# Altium footprint library Miscellaneous Devices LC.PcbLib: 776 footprints (part 7 of 49)
Each footprint in its own frame and in the unit in brackets; x right, y up, seen from the top. Pads: shape width x height; smd on the part's side, far side on the other; paste and mask are expansions set on the pad; w line width, h text height; cw(c..) or ccw(c..) is an arc to the next point about the centre after c.
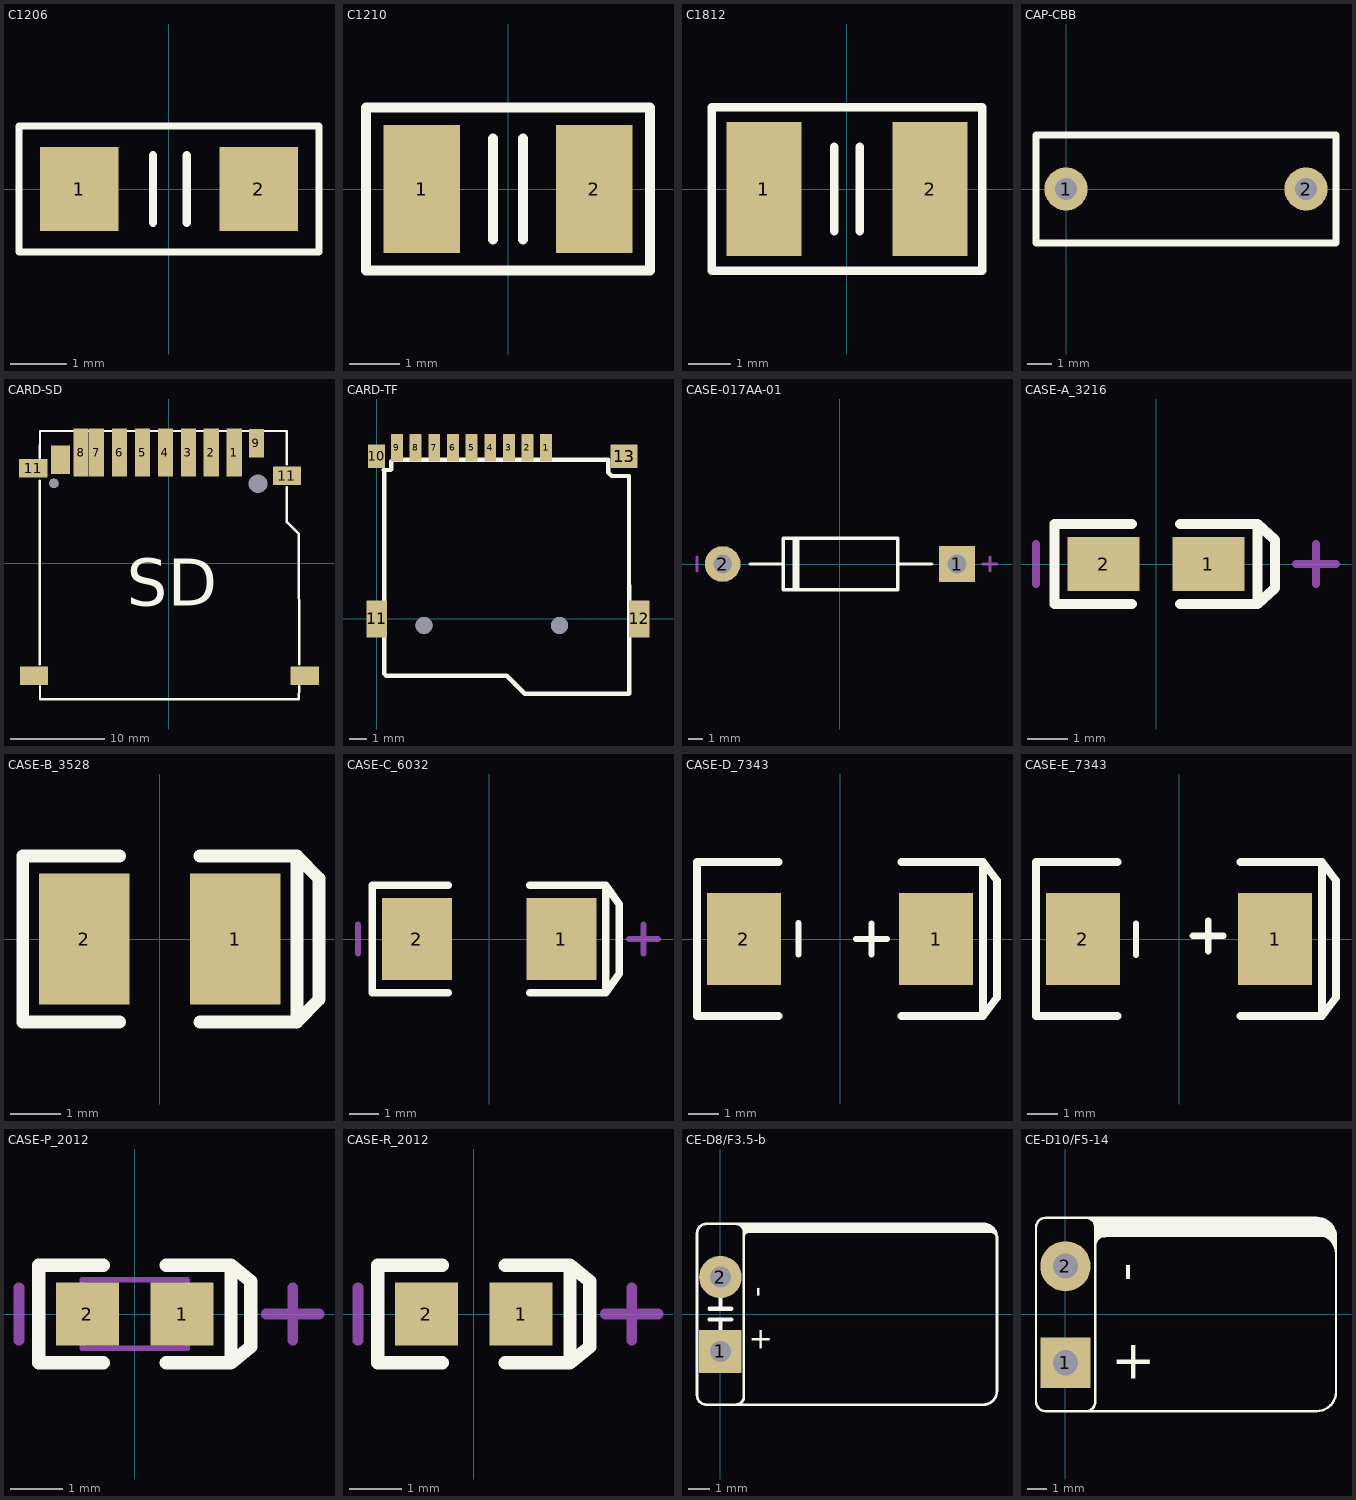
[diagram p6: the footprints below, top view; thin cyan lines are the x and y axes]

## C1206 [mm]
pads (2):
  rect 1.4x1.5 smd: 1(-1.6,0) 2(1.6,0)
Top Overlay:
  lines w0.127: -2.675,-1.125 2.675,-1.125 2.675,1.125 -2.675,1.125 -2.675,-1.125
  lines w0.15: -0.285,-0.6 -0.285,0.6 ; 0.315,-0.6 0.315,0.6
3D body "1206_C.step": height 0, standoff -0.94, extent -1.651,-0.762 1.549,0.838

## C1210 [mil]
pads (2):
  rect 60x100 smd: 1(-67.5,0) 2(67.5,0)
Top Overlay:
  lines w7.87: -11.81,-39.37 -11.81,39.37 ; 11.81,-39.37 11.81,39.37 ; -111.28,-63.78 -111.28,63.78 111.28,63.78 111.28,-63.78 -111.28,-63.78
3D body "1210_C.step": height 37.01, standoff 0, extent -65,-50 60.98,48.43

## C1812 [mil]
pads (2):
  rect 70x125 smd: 1(-77.5,0) 2(77.5,0)
Top Overlay:
  lines w7.87: -11.81,-39.37 -11.81,39.37 ; 11.81,-39.37 11.81,39.37 ; -126.28,-76.26 126.28,-76.26 126.28,76.26 -126.28,76.26 -126.28,-76.26
3D body "1812_C.step": height 48.82, standoff 0, extent -88.58,-65 88.58,60.98

## CAP-CBB [mm]
pads (2):
  round 1.8 hole 0.9: 1(0,0) 2(10,0)
Top Overlay:
  lines w0.305: -1.25,-2.25 -1.25,2.25 11.25,2.25 11.25,-2.25 -1.25,-2.25

## CARD-SD [mm]
pads (16):
  rect 1.6x5.08 smd: 1(6.913,11.712) 2(4.483,11.712) 3(2.053,11.712) 4(-0.377,11.712) 5(-2.807,11.712) 6(-5.237,11.712) 7(-7.667,11.712) 8(-9.327,11.712)
  rect 1.6x3 smd: 9(9.273,12.712)
  rect 3x2 smd: 11(-14.4,10.05) 11(12.5,9.25) ""(-14.3,-11.95) ""(14.4,-11.95)
  round 1 hole 1: ""(-12.2,8.45)
  rect 2x3 smd: ""(-11.5,10.95)
  round 1.8 hole 2: ""(9.444,8.41)
Top Overlay:
  lines w0.254: -13.7,-10.75 -13.7,8.75 ; -13.7,11.15 -13.67,13.998 12.492,13.998 12.5,10.45 ; -13.67,-13.05 -13.67,-14.45 13.762,-14.45 13.8,-13.05 ; 12.5,8.05 12.492,4.346 13.762,3.076 13.8,-10.75
  text "SD" at -4.5,-4.55 h5

## CARD-TF [mm]
pads (13):
  rect 0.7x1.6 smd: 1(10,10.1) 2(8.9,10.1) 3(7.8,10.1) 4(6.7,10.1) 5(5.6,10.1) 6(4.5,10.1) 7(3.4,10.1) 8(2.3,10.1) 9(1.2,10.1)
  rect 1x1.4 smd: 10(0,9.6)
  rect 1.2x2.2 smd: 11(0,0) 12(15.5,0)
  rect 1.6x1.4 smd: 13(14.6,9.6)
via 2.8,-0.4 diameter 1 hole 1
via 10.8,-0.4 diameter 1 hole 1
Top Overlay:
  lines w0.254: 14.88,-4.42 8.738,-4.42 7.671,-3.353 0.559,-3.353 0.457,-3.251 0.457,8.738 0.406,8.788 0.813,8.788 0.864,8.839 0.864,9.296 0.965,9.398 13.665,9.398 13.665,8.636 13.868,8.433 14.884,8.433 14.9,-4.4
3D body "TF-15X15.STEP": height 0.15, standoff -2.25, extent -0.325,-4.525 15.825,10.575

## CASE-017AA-01 [mm] "=CASE 017AA-01 Diode"
pads (2):
  rect 2.5x2.5 hole 1.3: 1(8.2,0)
  round 2.5 hole 1.3: 2(-8.2,0)
Top Overlay:
  lines w0.203: -6.3,0 -3.95,0 ; 4.1,0 6.45,0
  lines w0.254: -3.2,-1.8 -3.2,1.8 ; -2.95,-1.8 -2.95,1.8 ; -3.95,-1.8 4.05,-1.8 4.05,1.8 -3.95,1.8 -3.95,-1.8
Mechanical 15:
  lines w0.203: -10,-0.5 -10,0.5 ; 10,0 11,0 ; 10.5,-0.5 10.5,0.5
3D body "CASE 017AA-01.STEP": height 4.27, standoff -2.5, extent -8.75,-1.772 8.75,1.772

## CASE-A_3216 [mm]
pads (2):
  rect 1.8x1.35 smd: 1(1.31,0) 2(-1.31,0)
Top Overlay:
  lines w0.254: -0.6,-1.002 -2.537,-1.002 -2.537,1.002 -0.6,1.002 ; 0.6,-1.002 2.537,-1.002 ; 0.6,1.002 2.537,1.002 ; 2.537,-1.002 2.973,-0.6 2.973,0.6 2.537,1.002 ; 2.537,-1.002 2.537,1.002
Mechanical 15:
  lines w0.203: -3,-0.5 -3,0.5 ; 3.5,0 4.5,0 ; 4,-0.5 4,0.5
3D body "User Library-AVX_ACASE.STEP": height 1.71, standoff 0, extent -1.7,-0.84 1.7,0.84

## CASE-B_3528 [mm]
pads (2):
  rect 1.8x2.6 smd: 1(1.5,0) 2(-1.5,0)
Top Overlay:
  lines w0.254: -0.8,-1.65 -2.727,-1.65 -2.727,1.65 -0.8,1.65 ; 0.8,-1.65 2.727,-1.65 ; 0.8,1.65 2.727,1.65 ; 2.727,-1.65 3.163,-1.2 3.163,1.2 2.727,1.65 ; 2.727,-1.65 2.727,1.65
3D body "User Library-AVX_BCASE.STEP": height 2.03, standoff 0, extent -1.85,-1.465 1.85,1.465

## CASE-C_6032 [mm]
pads (2):
  rect 2.4x2.8 smd: 1(2.48,0) 2(-2.48,0)
Top Overlay:
  lines w0.254: -1.4,-1.85 -4.007,-1.85 -4.007,1.85 -1.4,1.85 ; 1.4,-1.85 4.007,-1.85 ; 1.4,1.85 4.007,1.85 ; 4.007,-1.85 4.47,-1.2 4.47,1.2 4.007,1.85 ; 4.007,-1.85 4.007,1.85
Mechanical 15:
  lines w0.203: -4.5,-0.5 -4.5,0.5 ; 4.8,0 5.8,0 ; 5.3,-0.5 5.3,0.5
3D body "User Library-AVX_C_CASE.STEP": height 2.7, standoff 0, extent -3.05,-1.675 3.05,1.675

## CASE-D_7343 [mm]
pads (2):
  rect 2.4x3 smd: 1(3.12,0) 2(-3.12,0)
Top Overlay:
  lines w0.203: -1.346,-0.492 -1.346,0.508 ; 0.522,0 1.522,0 ; 1.022,-0.5 1.022,0.5
  lines w0.254: -2,-2.5 -4.647,-2.5 -4.647,2.5 -2,2.5 ; 2,-2.5 4.647,-2.5 ; 2,2.5 4.647,2.5 ; 4.647,-2.5 4.647,2.5 ; 4.647,-2.5 5.1,-1.9 5.1,1.9 4.647,2.5
3D body "User Library-AVX_D_CASE.STEP": height 3.01, standoff 0, extent -3.701,-2.225 3.7,2.225

## CASE-E_7343 [mm]
pads (2):
  rect 2.4x3 smd: 1(3.12,0) 2(-3.12,0)
Top Overlay:
  lines w0.203: -1.397,-0.508 -1.397,0.492 ; 0.445,0.102 1.445,0.102 ; 0.945,-0.398 0.945,0.602
  lines w0.254: -2,-2.5 -4.647,-2.5 -4.647,2.5 -2,2.5 ; 2,-2.5 4.647,-2.5 ; 2,2.5 4.647,2.5 ; 4.647,-2.5 5.1,-1.9 5.1,1.9 4.647,2.5 ; 4.647,-2.5 4.647,2.5
3D body "User Library-AVX_E_CASE.STEP": height 4.2, standoff 0, extent -3.701,-2.225 3.7,2.225

## CASE-P_2012 [mm]
pads (2):
  rect 1.2x1.2 smd: 1(0.9,0) 2(-0.9,0)
Top Overlay:
  lines w0.254: -0.6,-0.927 -1.827,-0.927 -1.827,0.927 -0.6,0.927 ; 0.6,-0.927 1.827,-0.927 ; 0.6,0.927 1.827,0.927 ; 1.827,-0.927 1.827,0.927 ; 1.827,-0.927 2.2,-0.623 2.2,0.623 1.827,0.927
Mechanical 13:
  lines w0.1: -1,-0.65 -1,0.65 1,0.65 1,-0.65 -1,-0.65
Mechanical 15:
  lines w0.203: -2.2,-0.5 -2.2,0.5 ; 2.5,0 3.5,0 ; 3,-0.5 3,0.5

## CASE-R_2012 [mm]
pads (2):
  rect 1.2x1.2 smd: 1(0.9,0) 2(-0.9,0)
Top Overlay:
  lines w0.254: -0.6,-0.927 -1.827,-0.927 -1.827,0.927 -0.6,0.927 ; 0.6,-0.927 1.827,-0.927 ; 0.6,0.927 1.827,0.927 ; 1.827,-0.927 2.2,-0.623 2.2,0.623 1.827,0.927 ; 1.827,-0.927 1.827,0.927
Mechanical 15:
  lines w0.203: -2.2,-0.5 -2.2,0.5 ; 2.5,0 3.5,0 ; 3,-0.5 3,0.5
3D body "User Library-CaseR_2012-12.STEP": height 1.2, standoff 0, extent -1,-0.65 1,0.65

## CE-D8/F3.5-b [mm]
pads (2):
  rect 2x2 hole 1: 1(0,-1.75)
  round 2 hole 1: 2(0,1.75)
Top Overlay:
  region: 1.15,4.25 1,4.25 1,4.075 1.15,4.075
  region: 12.737,4.063 12.575,4.225 12.413,4.062 12.575,3.9
  region: 12.575,4.225 1.4,4.225 1.4,3.9 12.575,3.9
  region: 1.525,4.275 1.1,4.275 1.1,3.925 1.525,3.925
  region: 12.888,3.963 12.7,4.15 12.587,4.038 12.775,3.85
  region: 12.938,3.913 12.825,4.025 12.737,3.938 12.85,3.825
  region: 12.775,4.025 12.575,4.025 12.575,3.875 12.775,3.875
  lines w0.127: 0.725,-4.25 ccw(c0.725,-3.875) 1.1,-3.875 1.1,3.925 ; 0.725,4.25 cw(c0.725,3.875) 1.1,3.875 12.725,3.875 cw(c12.725,3.6) 13,3.6 ; 1.1,3.675 cw(c1.3,3.675) 1.3,3.875 ; 13,3.6 ccw(c12.35,3.6) 12.35,4.25 0.55,4.25 -0.65,4.25 ccw(c-0.65,3.8) -1.1,3.8 -1.1,-3.8 ccw(c-0.65,-3.8) -0.65,-4.25 0.55,-4.25 12.35,-4.25 ccw(c12.35,-3.6) 13,-3.6 13,3.6
  lines w0.2: -0.508,-0.25 0.508,-0.25 ; -0.508,0.258 0.508,0.258 ; 0,-0.758 0,-0.25 ; 0,0.258 0,0.766
  text "+" at 1.325,-1.625 h1
  text "-" at 2.175,0.8 h1
3D body "8X12.STEP": height -0.5, standoff -8.5, extent -1.165,-3.937 13.335,4.063

## CE-D10/F5-14 [mm]
pads (2):
  rect 2.6x2.6 hole 1.3: 1(0,-2.5)
  round 2.6 hole 1.3: 2(0,2.5)
Top Overlay:
  region: 1.8,4.125 1.6,4.125 1.6,4 1.8,4
  region: 1.7,4.15 1.55,4.15 1.55,3.925 1.7,3.925
  region: 1.5,5.05 1.35,5.05 1.35,4.85 1.5,4.85
  region: 1.7,5.025 1.45,5.025 1.45,4.725 1.7,4.725
  region: 14,3.8 13.85,3.8 13.85,3.625 14,3.625
  region: 14,3.925 13.775,3.925 13.775,3.725 14,3.725
  region: 13.8,4.125 13.575,4.125 13.575,3.9 13.8,3.9
  region: 14,4.075 13.7,4.075 13.7,3.825 14,3.825
  region: 13.7,4.25 13.275,4.25 13.275,4.025 13.7,4.025
  region: 13.9,4.475 13.625,4.475 13.625,4.175 13.9,4.175
  region: 13.825,4.6 13.55,4.6 13.55,4.225 13.825,4.225
  region: 13.95,4.35 13.5,4.35 13.5,3.975 13.95,3.975
  region: 13.625,4.825 13.5,4.825 13.5,4.675 13.625,4.675
  region: 13.375,4.95 13.15,4.95 13.15,4.775 13.375,4.775
  region: 13.525,4.875 13.175,4.875 13.175,4.6 13.525,4.6
  region: 13.75,4.725 13.05,4.725 13.05,4.075 13.75,4.075
  region: 13.275,5 12.8,5 12.8,4.1 13.275,4.1
  region: 13,5 1.55,5 1.55,4.05 13,4.05
  lines w0.127: -0.4,-2.95 ccw(c0.05,-2.95) 0.05,-3.4 1.05,-3.4 ; -0.4,1.45 cw(c0.05,1.45) 0.05,1.9 ; 1.55,3.575 cw(c2,3.6) 1.975,4.05 2.05,4.05 ; 2.05,4.075 14,4.075 ; 13,4.15 cw(c13,3.15) 14,3.15 ; 14,3.975 14,4.075 ; 14,4 ccw(c13,4) 13,5 1.05,5 ; 1.05,-5 ccw(c1.05,-4.5) 1.55,-4.5 1.55,4.5 ccw(c1.05,4.5) 1.05,5 ; 1.05,-5 -1.025,-5 cw(c-1.025,-4.5) -1.525,-4.5 -1.525,4.5 cw(c-1.025,4.5) -1.025,5 1.05,5 ; 1.05,-5 13,-5 ccw(c13,-4) 14,-4 14,4.075
  text "+" at 2.375,-3.325 h2
  text "-" at 4,1.7 h2
3D body "10X12.STEP": height 10, standoff 0, extent -1.038,-5 13.462,5